# Altium footprint library 排针排座.PcbLib: 344 footprints (part 5 of 22)
Each footprint in its own frame and in the unit in brackets; x right, y up, seen from the top. Pads: shape width x height; smd on the part's side, far side on the other; paste and mask are expansions set on the pad; w line width, h text height; cw(c..) or ccw(c..) is an arc to the next point about the centre after c.
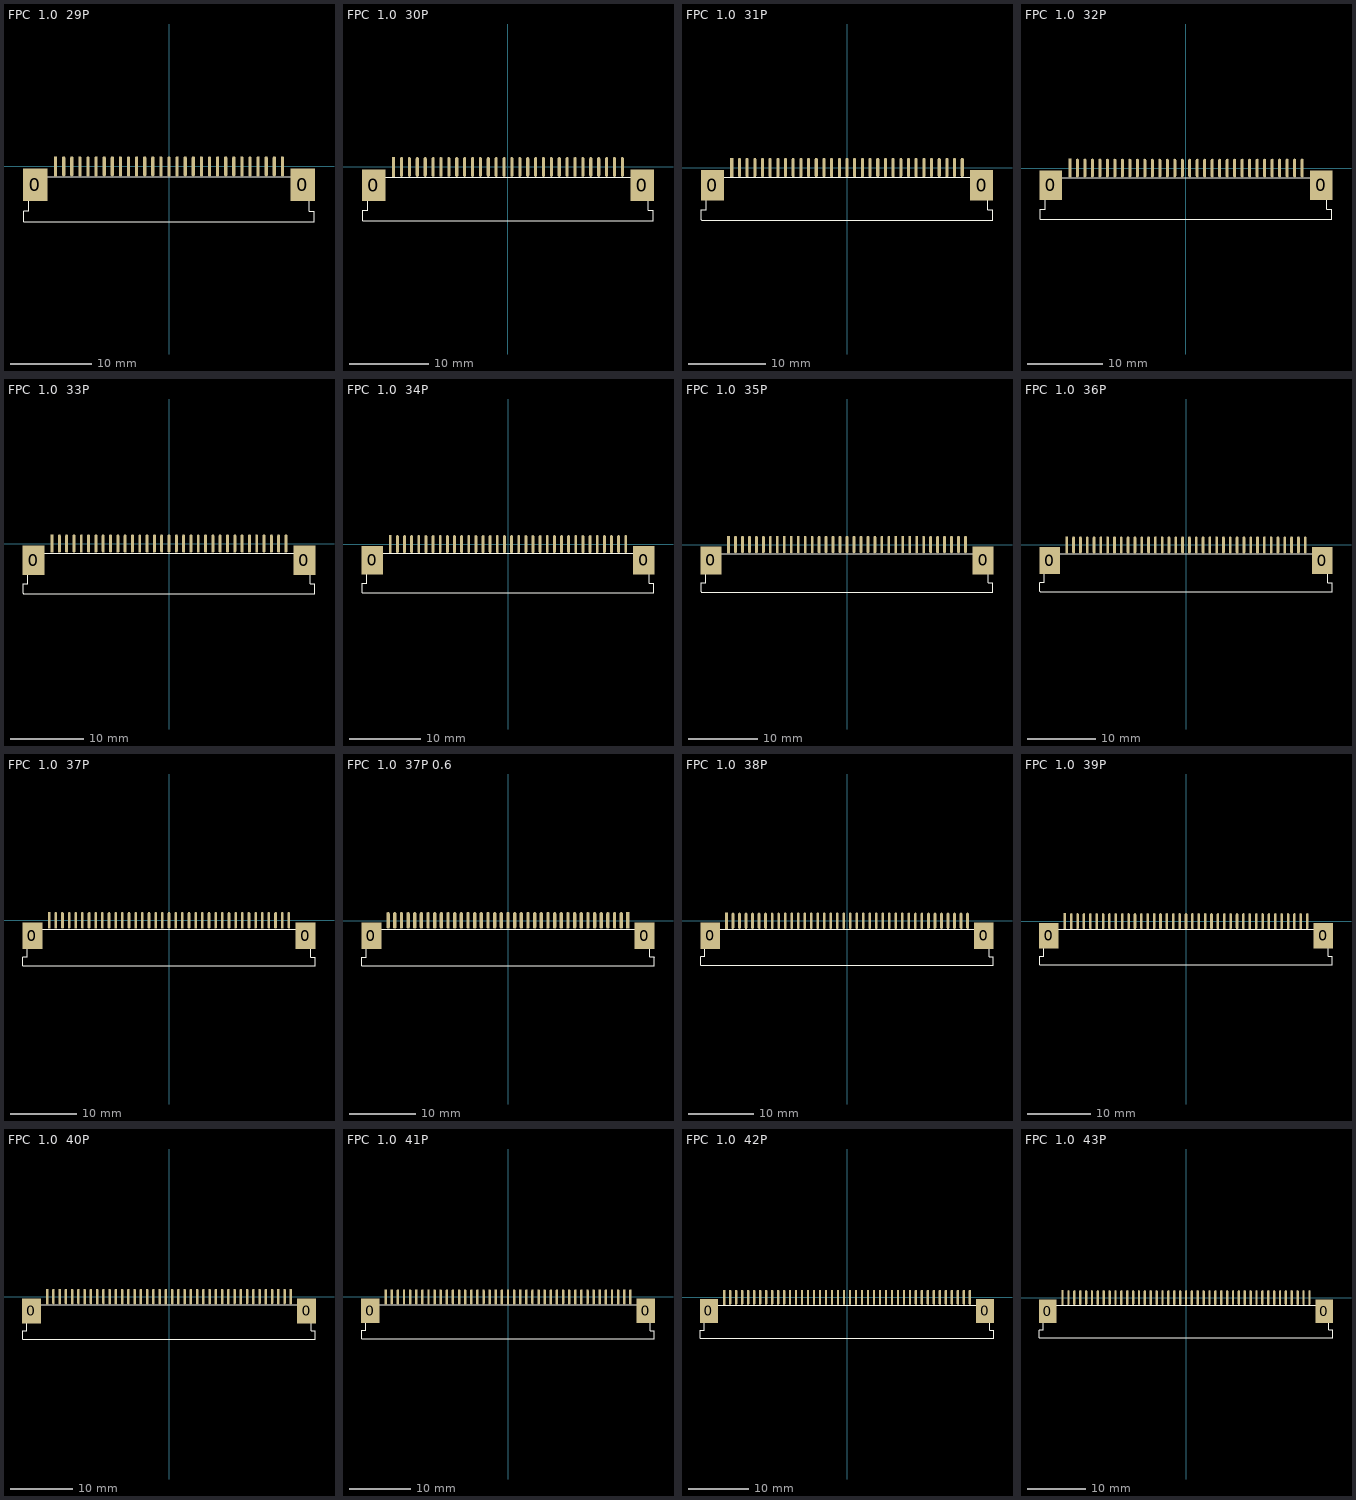
[diagram p4: the footprints below, top view; thin cyan lines are the x and y axes]

## FPC  1.0  29P [mm] "29 Pns"
height 2
pads (31):
  rect 3x4 smd: 0(-16.52,-2.289) 0(16.52,-2.289)
  rect 0.4x2.5 smd: 1(-14,0)
  oval 0.4x2.5 smd: 2(-13,0) 3(-12,0) 4(-11,0) 5(-10,0) 6(-9,0) 7(-8,0) 8(-7,0) 9(-6,0) 10(-5,0) 11(-4,0) 12(-3,0) 13(-2,0) 14(-1,0) 15(0,0) 16(1,0) 17(2,0) 18(3,0) 19(4,0) 20(5,0) 21(6,0) 22(7,0) 23(8,0) 24(9,0) 25(10,0) 26(11,0) 27(12,0) 28(13,0) 29(14,0)
Top Overlay:
  lines w0.127: -17.293,-1.295 -17.293,-5.474 -17.901,-5.474 -17.943,-5.515 -17.943,-6.807 -17.917,-6.833 17.943,-6.833 17.943,-5.513 17.293,-5.513 17.293,-1.293 -17.293,-1.293
3D body "FPC  1.0  29P.step": height 2.4, standoff 0, extent -17.9,-6.7 17.9,0

## FPC  1.0  30P [mm] "30 Pns"
height 2
pads (32):
  rect 3x4 smd: 0(-17.012,-2.289) 0(17.028,-2.289)
  rect 0.4x2.5 smd: 1(-14.492,0)
  oval 0.4x2.5 smd: 2(-13.492,0) 3(-12.492,0) 4(-11.492,0) 5(-10.492,0) 6(-9.492,0) 7(-8.492,0) 8(-7.492,0) 9(-6.492,0) 10(-5.492,0) 11(-4.492,0) 12(-3.492,0) 13(-2.492,0) 14(-1.492,0) 15(-0.492,0) 16(0.508,0) 17(1.508,0) 18(2.508,0) 19(3.508,0) 20(4.508,0) 21(5.508,0) 22(6.508,0) 23(7.508,0) 24(8.508,0) 25(9.508,0) 26(10.508,0) 27(11.508,0) 28(12.508,0) 29(13.508,0) 30(14.508,0)
Top Overlay:
  lines w0.127: -17.785,-1.295 -17.785,-5.474 -18.393,-5.474 -18.435,-5.515 -18.435,-6.807 -18.409,-6.833 18.451,-6.833 18.451,-5.513 17.801,-5.513 17.801,-1.293 -17.785,-1.293
3D body "FPC  1.0  30P.step": height 2.4, standoff 0, extent -18.4,-6.7 18.4,0

## FPC  1.0  31P [mm] "31 Pns"
height 2
pads (33):
  rect 3x4 smd: 0(-17.52,-2.289) 0(17.52,-2.289)
  rect 0.4x2.5 smd: 1(-15,0)
  oval 0.4x2.5 smd: 2(-14,0) 3(-13,0) 4(-12,0) 5(-11,0) 6(-10,0) 7(-9,0) 8(-8,0) 9(-7,0) 10(-6,0) 11(-5,0) 12(-4,0) 13(-3,0) 14(-2,0) 15(-1,0) 16(0,0) 17(1,0) 18(2,0) 19(3,0) 20(4,0) 21(5,0) 22(6,0) 23(7,0) 24(8,0) 25(9,0) 26(10,0) 27(11,0) 28(12,0) 29(13,0) 30(14,0) 31(15,0)
Top Overlay:
  lines w0.127: -18.293,-1.295 -18.293,-5.474 -18.901,-5.474 -18.943,-5.515 -18.943,-6.807 -18.917,-6.833 18.943,-6.833 18.943,-5.513 18.293,-5.513 18.293,-1.293 -18.293,-1.293
3D body "FPC  1.0  31P_2.step": height 2.4, standoff 0, extent -18.9,-6.7 18.9,0

## FPC  1.0  32P [mm] "32 Pins"
height 2
pads (34):
  rect 3x4 smd: 0(-18.02,-2.287) 0(18.02,-2.287)
  rect 0.4x2.5 smd: 1(-15.5,0.001)
  oval 0.4x2.5 smd: 2(-14.5,0.001) 3(-13.5,0.001) 4(-12.5,0.001) 5(-11.5,0.001) 6(-10.5,0.001) 7(-9.5,0.001) 8(-8.5,0.001) 9(-7.5,0.001) 10(-6.5,0.001) 11(-5.5,0.001) 12(-4.5,0.001) 13(-3.5,0.001) 14(-2.5,0.001) 15(-1.5,0.001) 16(-0.5,0.001) 17(0.5,0.001) 18(1.5,0.001) 19(2.5,0.001) 20(3.5,0.001) 21(4.5,0.001) 22(5.5,0.001) 23(6.5,0.001) 24(7.5,0.001) 25(8.5,0.001) 26(9.5,0.001) 27(10.5,0.001) 28(11.5,0.001) 29(12.5,0.001) 30(13.5,0.001) 31(14.5,0.001) 32(15.5,0.001)
Top Overlay:
  lines w0.127: -18.792,-1.294 -18.792,-5.473 -19.401,-5.473 -19.442,-5.514 -19.442,-6.806 -19.417,-6.831 19.443,-6.831 19.443,-5.511 18.793,-5.511 18.793,-1.291 -18.792,-1.291
3D body "FPC  1.0  32P_2.step": height 2.4, standoff 0, extent -19.4,-6.7 19.4,0

## FPC  1.0  33P [mm] "33 Pins"
height 2
pads (35):
  rect 3x4 smd: 0(-18.52,-2.289) 0(18.52,-2.289)
  rect 0.4x2.5 smd: 1(-16,0)
  oval 0.4x2.5 smd: 2(-15,0) 3(-14,0) 4(-13,0) 5(-12,0) 6(-11,0) 7(-10,0) 8(-9,0) 9(-8,0) 10(-7,0) 11(-6,0) 12(-5,0) 13(-4,0) 14(-3,0) 15(-2,0) 16(-1,0) 17(0,0) 18(1,0) 19(2,0) 20(3,0) 21(4,0) 22(5,0) 23(6,0) 24(7,0) 25(8,0) 26(9,0) 27(10,0) 28(11,0) 29(12,0) 30(13,0) 31(14,0) 32(15,0) 33(16,0)
Top Overlay:
  lines w0.127: -19.293,-1.295 -19.293,-5.474 -19.901,-5.474 -19.943,-5.515 -19.943,-6.807 -19.917,-6.833 19.943,-6.833 19.943,-5.513 19.293,-5.513 19.293,-1.293 -19.293,-1.293
3D body "FPC  1.0  33P.step": height 2.4, standoff 0, extent -19.9,-6.7 19.9,0

## FPC  1.0  34P [mm] "34 Pins"
height 2
pads (36):
  rect 3x4 smd: 0(-19.022,-2.289) 0(19.019,-2.289)
  rect 0.4x2.5 smd: 1(-16.501,0)
  oval 0.4x2.5 smd: 2(-15.501,0) 3(-14.501,0) 4(-13.501,0) 5(-12.501,0) 6(-11.501,0) 7(-10.501,0) 8(-9.501,0) 9(-8.501,0) 10(-7.501,0) 11(-6.501,0) 12(-5.501,0) 13(-4.501,0) 14(-3.501,0) 15(-2.501,0) 16(-1.501,0) 17(-0.501,0) 18(0.499,0) 19(1.499,0) 20(2.499,0) 21(3.499,0) 22(4.499,0) 23(5.499,0) 24(6.499,0) 25(7.499,0) 26(8.499,0) 27(9.499,0) 28(10.499,0) 29(11.499,0) 30(12.499,0) 31(13.499,0) 32(14.499,0) 33(15.499,0) 34(16.499,0)
Top Overlay:
  lines w0.127: -19.794,-1.295 -19.794,-5.474 -20.403,-5.474 -20.444,-5.515 -20.444,-6.807 -20.419,-6.833 20.442,-6.833 20.442,-5.513 19.792,-5.513 19.792,-1.293 -19.794,-1.293
3D body "FPC  1.0  34P.step": height 2.4, standoff 0, extent -20.4,-6.7 20.4,0

## FPC  1.0  35P [mm] "35 Pins"
height 2
pads (37):
  rect 3x4 smd: 0(-19.52,-2.289) 0(19.52,-2.289)
  rect 0.4x2.5 smd: 1(-17,0)
  oval 0.4x2.5 smd: 2(-16,0) 3(-15,0) 4(-14,0) 5(-13,0) 6(-12,0) 7(-11,0) 8(-10,0) 9(-9,0) 10(-8,0) 11(-7,0) 12(-6,0) 13(-5,0) 14(-4,0) 15(-3,0) 16(-2,0) 17(-1,0) 18(0,0) 19(1,0) 20(2,0) 21(3,0) 22(4,0) 23(5,0) 24(6,0) 25(7,0) 26(8,0) 27(9,0) 28(10,0) 29(11,0) 30(12,0) 31(13,0) 32(14,0) 33(15,0) 34(16,0) 35(17,0)
Top Overlay:
  lines w0.127: -20.293,-1.295 -20.293,-5.474 -20.901,-5.474 -20.943,-5.515 -20.943,-6.807 -20.917,-6.833 20.943,-6.833 20.943,-5.513 20.293,-5.513 20.293,-1.293 -20.293,-1.293
3D body "FPC  1.0  35P.step": height 2.4, standoff 0, extent -20.9,-6.7 20.9,0

## FPC  1.0  36P [mm] "36 Pins"
height 2
pads (38):
  rect 3x4 smd: 0(-20.038,-2.289) 0(20.003,-2.289)
  rect 0.4x2.5 smd: 1(-17.517,0)
  oval 0.4x2.5 smd: 2(-16.517,0) 3(-15.517,0) 4(-14.517,0) 5(-13.517,0) 6(-12.517,0) 7(-11.517,0) 8(-10.517,0) 9(-9.517,0) 10(-8.517,0) 11(-7.517,0) 12(-6.517,0) 13(-5.517,0) 14(-4.517,0) 15(-3.517,0) 16(-2.517,0) 17(-1.517,0) 18(-0.517,0) 19(0.483,0) 20(1.483,0) 21(2.483,0) 22(3.483,0) 23(4.483,0) 24(5.483,0) 25(6.483,0) 26(7.483,0) 27(8.483,0) 28(9.483,0) 29(10.483,0) 30(11.483,0) 31(12.483,0) 32(13.483,0) 33(14.483,0) 34(15.483,0) 35(16.483,0) 36(17.483,0)
Top Overlay:
  lines w0.127: -20.81,-1.295 -20.81,-5.474 -21.419,-5.474 -21.46,-5.515 -21.46,-6.807 -21.435,-6.833 21.426,-6.833 21.426,-5.513 20.776,-5.513 20.776,-1.293 -20.81,-1.293
3D body "FPC  1.0  36P.step": height 2.4, standoff 0, extent -21.4,-6.7 21.4,0

## FPC  1.0  37P [mm] "37 Pins"
height 2
pads (39):
  rect 3x4 smd: 0(-20.52,-2.289) 0(20.52,-2.289)
  rect 0.4x2.5 smd: 1(-18,0)
  oval 0.4x2.5 smd: 2(-17,0) 3(-16,0) 4(-15,0) 5(-14,0) 6(-13,0) 7(-12,0) 8(-11,0) 9(-10,0) 10(-9,0) 11(-8,0) 12(-7,0) 13(-6,0) 14(-5,0) 15(-4,0) 16(-3,0) 17(-2,0) 18(-1,0) 19(0,0) 20(1,0) 21(2,0) 22(3,0) 23(4,0) 24(5,0) 25(6,0) 26(7,0) 27(8,0) 28(9,0) 29(10,0) 30(11,0) 31(12,0) 32(13,0) 33(14,0) 34(15,0) 35(16,0) 36(17,0) 37(18,0)
Top Overlay:
  lines w0.127: -21.293,-1.295 -21.293,-5.474 -21.901,-5.474 -21.943,-5.515 -21.943,-6.807 -21.917,-6.833 21.943,-6.833 21.943,-5.513 21.293,-5.513 21.293,-1.293 -21.293,-1.293
3D body "FPC  1.0  37P.step": height 2.4, standoff 0, extent -21.9,-6.7 21.9,0

## FPC  1.0  37P 0.6 [mm] "37 Pins"
height 2
pads (39):
  rect 3x4 smd: 0(-20.545,-2.263) 0(20.495,-2.263)
  rect 0.5x2.5 smd: 1(17.975,0.025)
  oval 0.5x2.5 smd: 2(16.975,0.025) 3(15.975,0.025) 4(14.975,0.025) 5(13.975,0.025) 6(12.975,0.025) 7(11.975,0.025) 8(10.975,0.025) 9(9.975,0.025) 10(8.975,0.025) 11(7.975,0.025) 12(6.975,0.025) 13(5.975,0.025) 14(4.975,0.025) 15(3.975,0.025) 16(2.975,0.025) 17(1.975,0.025) 18(0.975,0.025) 19(-0.025,0.025) 20(-1.025,0.025) 21(-2.025,0.025) 22(-3.025,0.025) 23(-4.025,0.025) 24(-5.025,0.025) 25(-6.025,0.025) 26(-7.025,0.025) 27(-8.025,0.025) 28(-9.025,0.025) 29(-10.025,0.025) 30(-11.025,0.025) 31(-12.025,0.025) 32(-13.025,0.025) 33(-14.025,0.025) 34(-15.025,0.025) 35(-16.025,0.025) 36(-17.025,0.025) 37(-18.025,0.025)
Top Overlay:
  lines w0.127: 21.267,-1.27 21.267,-5.449 21.876,-5.449 21.917,-5.49 21.917,-6.782 21.892,-6.807 -21.968,-6.807 -21.968,-5.487 -21.318,-5.487 -21.318,-1.267 21.267,-1.267

## FPC  1.0  38P [mm] "41 Pins"
height 2
pads (40):
  rect 3x4 smd: 0(-21.022,-2.289) 0(21.019,-2.289)
  rect 0.4x2.5 smd: 1(-18.501,0)
  oval 0.4x2.5 smd: 2(-17.501,0) 3(-16.501,0) 4(-15.501,0) 5(-14.501,0) 6(-13.501,0) 7(-12.501,0) 8(-11.501,0) 9(-10.501,0) 10(-9.501,0) 11(-8.501,0) 12(-7.501,0) 13(-6.501,0) 14(-5.501,0) 15(-4.501,0) 16(-3.501,0) 17(-2.501,0) 18(-1.501,0) 19(-0.501,0) 20(0.499,0) 21(1.499,0) 22(2.499,0) 23(3.499,0) 24(4.499,0) 25(5.499,0) 26(6.499,0) 27(7.499,0) 28(8.499,0) 29(9.499,0) 30(10.499,0) 31(11.499,0) 32(12.499,0) 33(13.499,0) 34(14.499,0) 35(15.499,0) 36(16.499,0) 37(17.499,0) 38(18.499,0)
Top Overlay:
  lines w0.127: -21.794,-1.295 -21.794,-5.474 -22.403,-5.474 -22.444,-5.515 -22.444,-6.807 -22.419,-6.833 22.442,-6.833 22.442,-5.513 21.792,-5.513 21.792,-1.293 -21.794,-1.293
3D body "FPC  1.0  38P.step": height 2.4, standoff 0, extent -22.4,-6.7 22.4,0

## FPC  1.0  39P [mm] "39 Pins"
height 2
pads (41):
  rect 3x4 smd: 0(-21.52,-2.289) 0(21.52,-2.289)
  rect 0.4x2.5 smd: 1(-19,0)
  oval 0.4x2.5 smd: 2(-18,0) 3(-17,0) 4(-16,0) 5(-15,0) 6(-14,0) 7(-13,0) 8(-12,0) 9(-11,0) 10(-10,0) 11(-9,0) 12(-8,0) 13(-7,0) 14(-6,0) 15(-5,0) 16(-4,0) 17(-3,0) 18(-2,0) 19(-1,0) 20(0,0) 21(1,0) 22(2,0) 23(3,0) 24(4,0) 25(5,0) 26(6,0) 27(7,0) 28(8,0) 29(9,0) 30(10,0) 31(11,0) 32(12,0) 33(13,0) 34(14,0) 35(15,0) 36(16,0) 37(17,0) 38(18,0) 39(19,0)
Top Overlay:
  lines w0.127: -22.293,-1.295 -22.293,-5.474 -22.901,-5.474 -22.943,-5.515 -22.943,-6.807 -22.917,-6.833 22.943,-6.833 22.943,-5.513 22.293,-5.513 22.293,-1.293 -22.293,-1.293
3D body "FPC  1.0  39P.step": height 2.4, standoff 0, extent -22.9,-6.7 22.9,0

## FPC  1.0  40P [mm] "40 Pins"
height 2
pads (42):
  rect 3x4 smd: 0(-22.038,-2.289) 0(22.003,-2.289)
  rect 0.4x2.5 smd: 1(-19.517,0)
  oval 0.4x2.5 smd: 2(-18.517,0) 3(-17.517,0) 4(-16.517,0) 5(-15.517,0) 6(-14.517,0) 7(-13.517,0) 8(-12.517,0) 9(-11.517,0) 10(-10.517,0) 11(-9.517,0) 12(-8.517,0) 13(-7.517,0) 14(-6.517,0) 15(-5.517,0) 16(-4.517,0) 17(-3.517,0) 18(-2.517,0) 19(-1.517,0) 20(-0.517,0) 21(0.483,0) 22(1.483,0) 23(2.483,0) 24(3.483,0) 25(4.483,0) 26(5.483,0) 27(6.483,0) 28(7.483,0) 29(8.483,0) 30(9.483,0) 31(10.483,0) 32(11.483,0) 33(12.483,0) 34(13.483,0) 35(14.483,0) 36(15.483,0) 37(16.483,0) 38(17.483,0) 39(18.483,0) 40(19.483,0)
Top Overlay:
  lines w0.127: -22.81,-1.295 -22.81,-5.474 -23.419,-5.474 -23.46,-5.515 -23.46,-6.807 -23.435,-6.833 23.426,-6.833 23.426,-5.513 22.776,-5.513 22.776,-1.293 -22.81,-1.293
3D body "FPC  1.0  40P.step": height 2.4, standoff 0, extent -23.4,-6.7 23.4,0

## FPC  1.0  41P [mm] "41 Pins"
height 2
pads (43):
  rect 3x4 smd: 0(-22.52,-2.289) 0(22.52,-2.289)
  rect 0.4x2.5 smd: 1(-20,0)
  oval 0.4x2.5 smd: 2(-19,0) 3(-18,0) 4(-17,0) 5(-16,0) 6(-15,0) 7(-14,0) 8(-13,0) 9(-12,0) 10(-11,0) 11(-10,0) 12(-9,0) 13(-8,0) 14(-7,0) 15(-6,0) 16(-5,0) 17(-4,0) 18(-3,0) 19(-2,0) 20(-1,0) 21(0,0) 22(1,0) 23(2,0) 24(3,0) 25(4,0) 26(5,0) 27(6,0) 28(7,0) 29(8,0) 30(9,0) 31(10,0) 32(11,0) 33(12,0) 34(13,0) 35(14,0) 36(15,0) 37(16,0) 38(17,0) 39(18,0) 40(19,0) 41(20,0)
Top Overlay:
  lines w0.127: -23.293,-1.295 -23.293,-5.474 -23.901,-5.474 -23.943,-5.515 -23.943,-6.807 -23.917,-6.833 23.943,-6.833 23.943,-5.513 23.293,-5.513 23.293,-1.293 -23.293,-1.293
3D body "FPC  1.0  41P.step": height 2.4, standoff 0, extent -23.9,-6.7 23.9,0

## FPC  1.0  42P [mm] "42 Pins"
height 2
pads (44):
  rect 3x4 smd: 0(-23.022,-2.289) 0(23.019,-2.289)
  rect 0.4x2.5 smd: 1(-20.501,0)
  oval 0.4x2.5 smd: 2(-19.501,0) 3(-18.501,0) 4(-17.501,0) 5(-16.501,0) 6(-15.501,0) 7(-14.501,0) 8(-13.501,0) 9(-12.501,0) 10(-11.501,0) 11(-10.501,0) 12(-9.501,0) 13(-8.501,0) 14(-7.501,0) 15(-6.501,0) 16(-5.501,0) 17(-4.501,0) 18(-3.501,0) 19(-2.501,0) 20(-1.501,0) 21(-0.501,0) 22(0.499,0) 23(1.499,0) 24(2.499,0) 25(3.499,0) 26(4.499,0) 27(5.499,0) 28(6.499,0) 29(7.499,0) 30(8.499,0) 31(9.499,0) 32(10.499,0) 33(11.499,0) 34(12.499,0) 35(13.499,0) 36(14.499,0) 37(15.499,0) 38(16.499,0) 39(17.499,0) 40(18.499,0) 41(19.499,0) 42(20.499,0)
Top Overlay:
  lines w0.127: -23.794,-1.295 -23.794,-5.474 -24.403,-5.474 -24.444,-5.515 -24.444,-6.807 -24.419,-6.833 24.442,-6.833 24.442,-5.513 23.792,-5.513 23.792,-1.293 -23.794,-1.293
3D body "FPC  1.0  42P.step": height 2.4, standoff 0, extent -24.4,-6.7 24.4,0

## FPC  1.0  43P [mm] "43 Pins"
height 2
pads (45):
  rect 3x4 smd: 0(-23.52,-2.289) 0(23.52,-2.289)
  rect 0.4x2.5 smd: 1(-21,0)
  oval 0.4x2.5 smd: 2(-20,0) 3(-19,0) 4(-18,0) 5(-17,0) 6(-16,0) 7(-15,0) 8(-14,0) 9(-13,0) 10(-12,0) 11(-11,0) 12(-10,0) 13(-9,0) 14(-8,0) 15(-7,0) 16(-6,0) 17(-5,0) 18(-4,0) 19(-3,0) 20(-2,0) 21(-1,0) 22(0,0) 23(1,0) 24(2,0) 25(3,0) 26(4,0) 27(5,0) 28(6,0) 29(7,0) 30(8,0) 31(9,0) 32(10,0) 33(11,0) 34(12,0) 35(13,0) 36(14,0) 37(15,0) 38(16,0) 39(17,0) 40(18,0) 41(19,0) 42(20,0) 43(21,0)
Top Overlay:
  lines w0.127: -24.293,-1.295 -24.293,-5.474 -24.901,-5.474 -24.943,-5.515 -24.943,-6.807 -24.917,-6.833 24.943,-6.833 24.943,-5.513 24.293,-5.513 24.293,-1.293 -24.293,-1.293
3D body "FPC  1.0  43P.step": height 2.4, standoff 0, extent -24.9,-6.7 24.9,0